# Altium footprint library 学习.PcbLib: 96 footprints (part 4 of 6)
Each footprint in its own frame and in the unit in brackets; x right, y up, seen from the top. Pads: shape width x height; smd on the part's side, far side on the other; paste and mask are expansions set on the pad; w line width, h text height; cw(c..) or ccw(c..) is an arc to the next point about the centre after c.
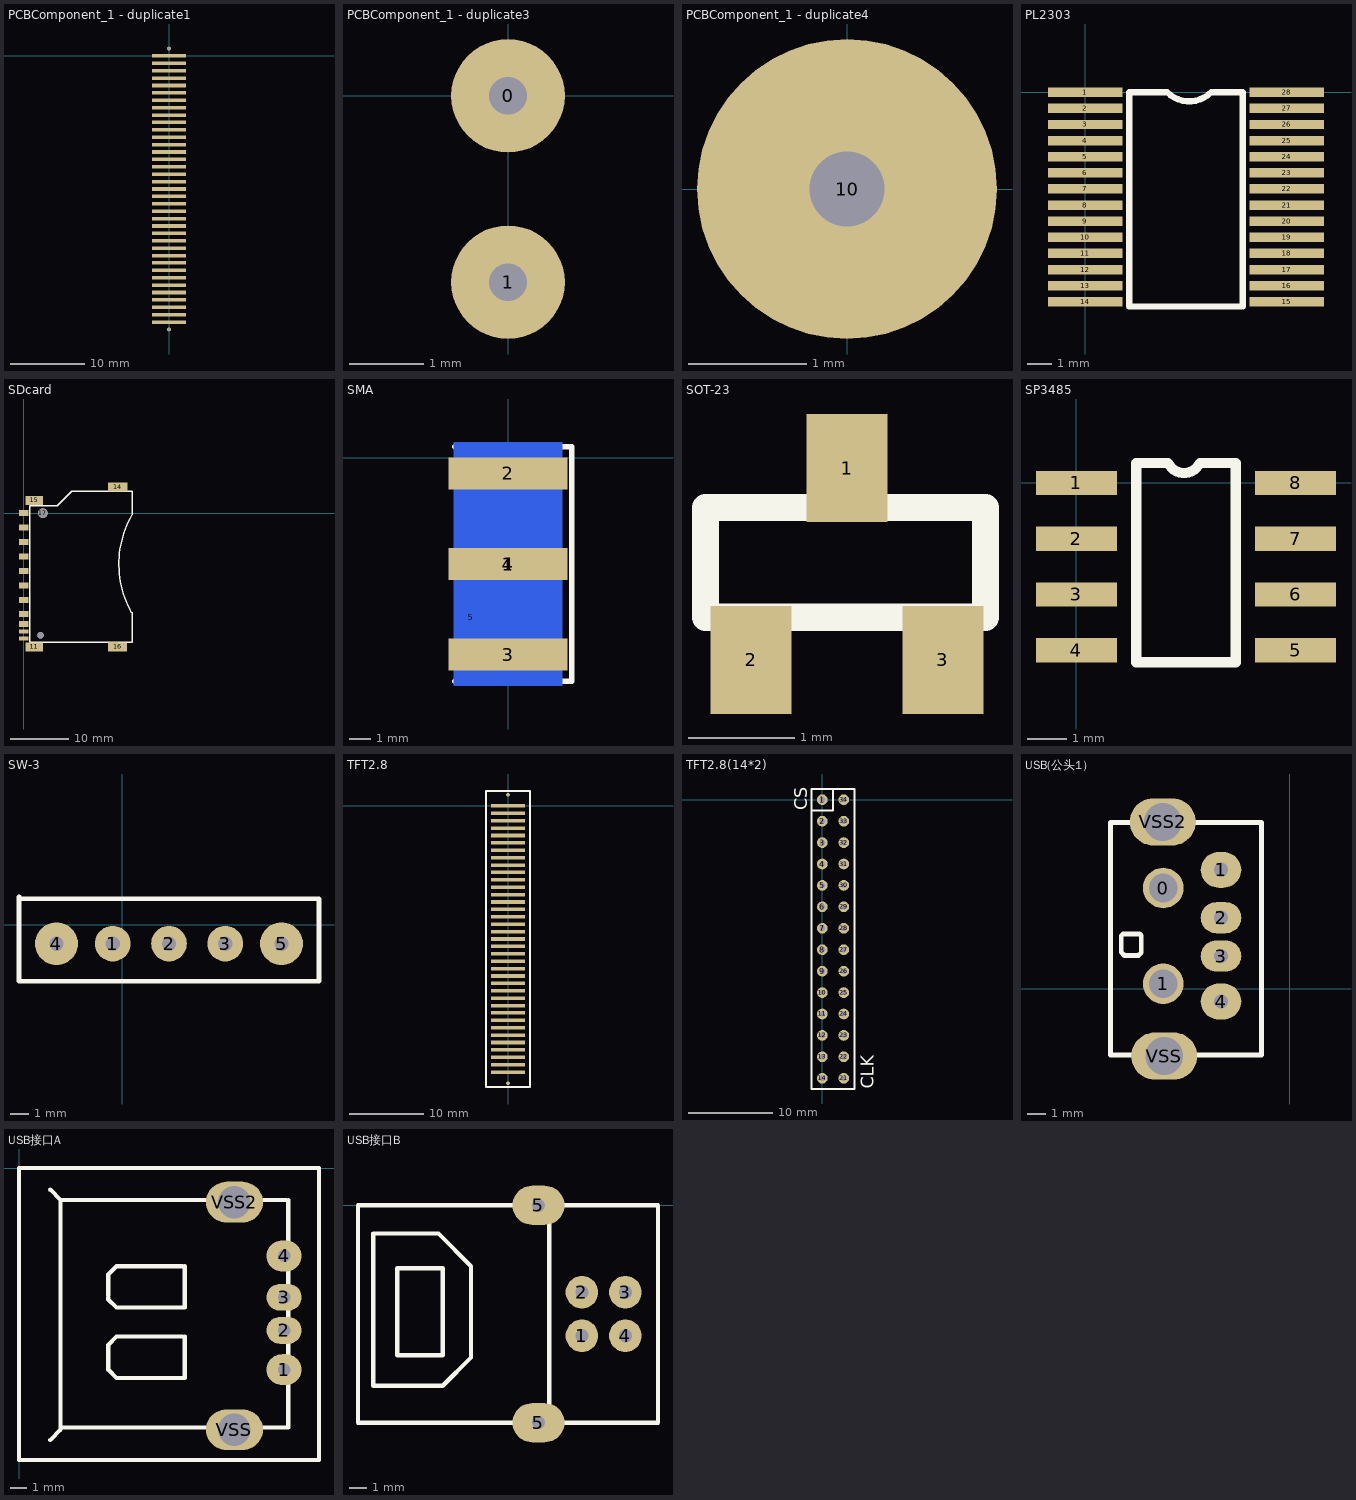
[diagram p3: the footprints below, top view; thin cyan lines are the x and y axes]

## PCBComponent_1 - duplicate1 [mil]
pads (39):
  rect 180x19 all layers, no hole: 1(0,0) 2(0,-39.37) 3(0,-78.74) 4(0,-118.11) 5(0,-157.48) 6(0,-196.85) 7(0,-236.22) 8(0,-275.59) 9(0,-314.96) 10(0,-354.33) 11(0,-393.7) 12(0,-433.07) 13(0,-472.44) 14(0,-511.81) 15(0,-551.18) 16(0,-590.55) 17(0,-629.92) 18(0,-669.29) 19(0,-708.66) 20(0,-748.03) 21(0,-787.4) 22(0,-826.77) 23(0,-866.14) 24(0,-905.51) 25(0,-944.88) 26(0,-984.25) 27(0,-1023.62) 28(0,-1062.99) 29(0,-1102.36) 30(0,-1141.73) 31(0,-1181.1) 32(0,-1220.47) 33(0,-1259.84) 34(0,-1299.21) 35(0,-1338.58) 36(0,-1377.95) 37(0,-1417.32)
  round 20 hole 15: 40(0,39.37) 41(0,-1456.69)

## PCBComponent_1 - duplicate2 [mil]

## PCBComponent_1 - duplicate3 [mil]
pads (2):
  round 60 hole 20: 0(0,0) 1(0,-98.43)

## PCBComponent_1 - duplicate4 [mil]
pads (1):
  round 100 hole 25: 10(0,0)

## PCBComponent_1 - duplicate5 [mil]

## PL2303 [mm]
pads (28):
  rect 3x0.38 smd: 1(0,0) 2(0,-0.65) 3(0,-1.3) 4(0,-1.95) 5(0,-2.6) 6(0,-3.25) 7(0,-3.9) 8(0,-4.55) 9(0,-5.2) 10(0,-5.85) 11(0,-6.5) 12(0,-7.15) 13(0,-7.8) 14(0,-8.45) 15(8.128,-8.45) 16(8.128,-7.8) 17(8.128,-7.15) 18(8.128,-6.5) 19(8.128,-5.85) 20(8.128,-5.2) 21(8.128,-4.55) 22(8.128,-3.9) 23(8.128,-3.25) 24(8.128,-2.6) 25(8.128,-1.95) 26(8.128,-1.3) 27(8.128,-0.65) 28(8.128,0)
Top Overlay:
  lines w0.254: 1.778,-8.636 1.778,0 3.302,0 ccw(c4.191,0.889) 5.08,0 6.35,0 6.35,-8.636 1.778,-8.636

## SDcard [mil]
pads (18):
  rect 65x40 smd: 1(0,-98.43) 2(0,-196.85) 3(0,-295.28) 4(0,-393.7) 5(0,-492.13) 6(0,-590.55) 7(0,-686.02) 8(0,-752.95) 9(0,0)
  rect 65x28 smd: 10(0,-804.13) 12(0,-851.38)
  rect 120x60 smd: 11(70.87,-909.45) 15(70.87,86.61)
  rect 60x60 smd: 13(610.24,-905.51)
  rect 130x60 smd: 14(638.78,177.17) 16(637.8,-909.45)
  round 67 hole 66: 17(129.92,0)
  round 44 hole 43: 18(114.17,-830.71)
Top Overlay:
  lines w10: 39.37,0 39.37,49.21 226.38,49.21 324.8,147.64 738.19,147.64 738.19,-9.84 ; 39.37,19.68 39.37,-875.98 738.19,-875.98 738.19,-672.57 ; 732.02,-675.99 cw(c1326.65,-345.63) 735.83,-8.5

## SMA [mil]
pads (5):
  rect 220x60 smd: 1(0,-196.85) 2(0,-29.53) 3(0,-364.17)
  rect 200x450 smd far side: 4(0,-196.85)
  round 20 smd far side: 5(-68.9,-295.28)
Top Overlay:
  lines w10: -98.43,-413.39 118.11,-413.39 118.11,19.68 -98.43,19.68

## SOT-23 [mil]
pads (3):
  rect 30x40 all layers, no hole: 1(102.36,-35.43) 2(66.93,-106.3) 3(137.8,-106.3)
Top Overlay:
  lines w10: 50,-90.55 50,-50 153.54,-50 153.54,-90.55 50,-90.55

## SP3485 [mil]
pads (8):
  rect 80x24 smd: 1(0,0) 2(0,-55.12) 3(0,-110.24) 4(0,-165.35) 5(216.54,-165.35) 6(216.54,-110.24) 7(216.54,-55.12) 8(216.54,0)
Top Overlay:
  lines w10: 70.87,19.68 90.55,19.68 ccw(c106.3,27.56) 122.05,19.68 157.48,19.68 157.48,-177.17 59.06,-177.17 59.06,19.68 82.68,19.68

## SW-3 [mm]
pads (5):
  round 1.905 hole 0.762: 1(-0.5,-1) 2(2.5,-1) 3(5.5,-1)
  round 2.286 hole 0.762: 4(-3.5,-1) 5(8.5,-1)
Top Overlay:
  lines w0.254: -5.5,-3 -5.5,1.5 -5.4,1.4 10.5,1.4 10.5,-3 -5.5,-3

## TFT2.8 [mil]
pads (39):
  rect 180x19 all layers, no hole: 1(0,0) 2(0,-39.37) 3(0,-78.74) 4(0,-118.11) 5(0,-157.48) 6(0,-196.85) 7(0,-236.22) 8(0,-275.59) 9(0,-314.96) 10(0,-354.33) 11(0,-393.7) 12(0,-433.07) 13(0,-472.44) 14(0,-511.81) 15(0,-551.18) 16(0,-590.55) 17(0,-629.92) 18(0,-669.29) 19(0,-708.66) 20(0,-748.03) 21(0,-787.4) 22(0,-826.77) 23(0,-866.14) 24(0,-905.51) 25(0,-944.88) 26(0,-984.25) 27(0,-1023.62) 28(0,-1062.99) 29(0,-1102.36) 30(0,-1141.73) 31(0,-1181.1) 32(0,-1220.47) 33(0,-1259.84) 34(0,-1299.21) 35(0,-1338.58) 36(0,-1377.95) 37(0,-1417.32)
  round 20 hole 1: 40(0,59.06) 41(0,-1476.38)
Top Overlay:
  lines w10: -118.11,-1496.06 118.11,-1496.06 118.11,78.74 -118.11,78.74 -118.11,-1496.06

## TFT2.8(14*2) [mil]
pads (28):
  round 50 hole 25: 1(0,0) 2(0,-100) 3(0,-200) 4(0,-300) 5(0,-400) 6(0,-500) 7(0,-600) 8(0,-700) 9(0,-800) 10(0,-900) 11(0,-1000) 12(0,-1100) 13(0,-1200) 14(0,-1300) 21(100,-1300) 22(100,-1200) 23(100,-1100) 24(100,-1000) 25(100,-900) 26(100,-800) 27(100,-700) 28(100,-600) 29(100,-500) 30(100,-400) 31(100,-300) 32(100,-200) 33(100,-100) 34(100,0)
Top Overlay:
  lines w10: -50,-50 50,-50 50,50 ; -50,-1350 150,-1350 150,50 -50,50 -50,-1350
  text "CLK" at 240,-1350 h60
  text "CS" at -70,-50 h60

## USB(公头1） [mil]
pads (8):
  round 85 hole 60: 0(-264,210) 1(-264,10)
  oval 85x75 hole 30 paste+0: 1(-143.37,247.91) 4(-143.37,-27.09)
  oval 85x65 hole 30: 2(-143.37,147.91) 3(-143.37,67.91)
  oval 137.79x98.42 hole 78.74: VSS(-262,-141) VSS2(-265,348)
Top Overlay:
  lines w10: -374,-130 -374,345 ; -374,-139 -59,-139 -59,347 -374,347 -374,-139 ; -352,76 -345,69 -316,69 -310,75 -310,111 -313,114 -348,114 -352,110 -352,76

## USB接口A [mil]
pads (6):
  oval 85x75 hole 30 paste+0: 1(640.63,-487.09) 4(640.63,-212.09)
  oval 85x65 hole 30: 2(640.63,-392.09) 3(640.63,-312.09)
  oval 137.79x98.42 hole 78.74: VSS(520.63,-632.09) VSS2(520.63,-82.09)
Top Overlay:
  lines w10: 75.63,-657.09 100.63,-632.09 100.63,-627.09 ; 75.63,-52.09 100.63,-77.09 ; 215.63,-482.09 215.63,-487.09 235.63,-507.09 400.63,-507.09 400.63,-407.09 ; 215.63,-477.09 215.63,-427.09 235.63,-407.09 395.63,-407.09 ; 215.63,-312.09 215.63,-317.09 235.63,-337.09 400.63,-337.09 400.63,-237.09 ; 215.63,-307.09 215.63,-257.09 235.63,-237.09 395.63,-237.09 ; 645.63,-77.09 100.63,-77.09 ; 650.63,-77.09 650.63,-627.09 100.63,-627.09 ; 100.63,-627.09 100.63,-77.09 ; 0,-705 725,-705 725,0 0,0 0,-705

## USB接口B [mil]
pads (6):
  round 75 hole 30 paste+0: 1(625,-300) 2(625,-200) 3(725,-200) 4(725,-300)
  oval 120x90 hole 30: 5(525,-500) 5(525,0)
Top Overlay:
  lines w10: 550,-500 550,0 ; 110,-500 110,0 800,0 800,-500 110,-500 ; 145,-415 145,-65 295,-65 370,-140 370,-350 305,-415 145,-415 ; 200,-345 305,-345 305,-145 200,-145 200,-345